# Altium footprint library Modules.PcbLib: 1 footprints
Each footprint in its own frame and in the unit in brackets; x right, y up, seen from the top. Pads: shape width x height; smd on the part's side, far side on the other; paste and mask are expansions set on the pad; w line width, h text height; cw(c..) or ccw(c..) is an arc to the next point about the centre after c.
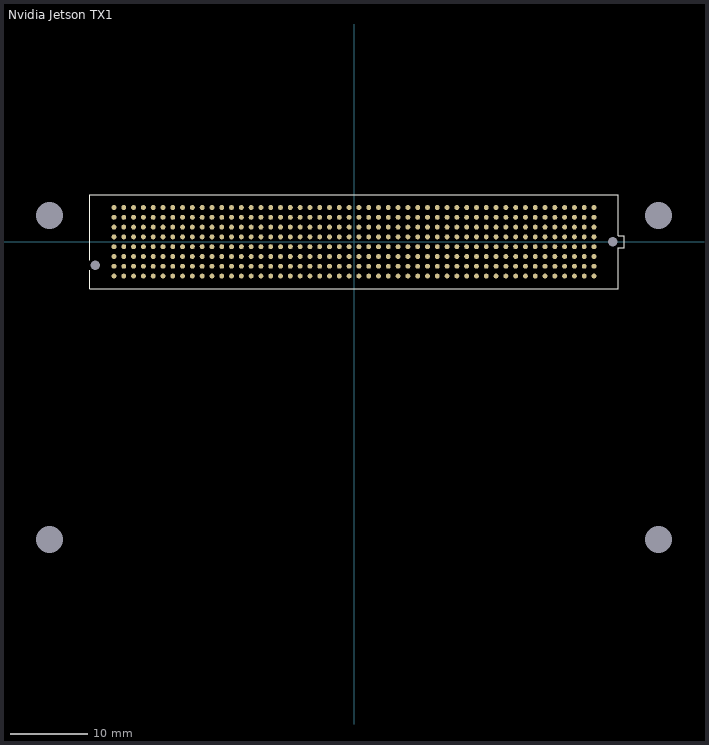
[diagram p0: the footprint, top view; thin cyan lines are the x and y axes]

## Nvidia Jetson TX1 [mm]
pads (406):
  round 0 hole 3.5 unplated: 0(-39.501,-38.6) 0(-39.501,3.4) 0(39.499,-38.6) 0(39.499,3.4)
  round 0 hole 1.27 unplated: 0(-33.541,-3.048) 0(33.541,0)
  round 0.635 smd paste+0.254 mask+0.05: A1(31.115,4.445) A2(29.845,4.445) A3(28.575,4.445) A4(27.305,4.445) A5(26.035,4.445) A6(24.765,4.445) A7(23.495,4.445) A8(22.225,4.445) A9(20.955,4.445) A10(19.685,4.445) A11(18.415,4.445) A12(17.145,4.445) A13(15.875,4.445) A14(14.605,4.445) A15(13.335,4.445) A16(12.065,4.445) A17(10.795,4.445) A18(9.525,4.445) A19(8.255,4.445) A20(6.985,4.445) A21(5.715,4.445) A22(4.445,4.445) A23(3.175,4.445) A24(1.905,4.445) A25(0.635,4.445) A26(-0.635,4.445) A27(-1.905,4.445) A28(-3.175,4.445) A29(-4.445,4.445) A30(-5.715,4.445) A31(-6.985,4.445) A32(-8.255,4.445) A33(-9.525,4.445) A34(-10.795,4.445) A35(-12.065,4.445) A36(-13.335,4.445) A37(-14.605,4.445) A38(-15.875,4.445) A39(-17.145,4.445) A40(-18.415,4.445) A41(-19.685,4.445) A42(-20.955,4.445) A43(-22.225,4.445) A44(-23.495,4.445) A45(-24.765,4.445) A46(-26.035,4.445) A47(-27.305,4.445) A48(-28.575,4.445) A49(-29.845,4.445) A50(-31.115,4.445) B1(31.115,3.175) B2(29.845,3.175) B3(28.575,3.175) B4(27.305,3.175) B5(26.035,3.175) B6(24.765,3.175) B7(23.495,3.175) B8(22.225,3.175) B9(20.955,3.175) B10(19.685,3.175) B11(18.415,3.175) B12(17.145,3.175) B13(15.875,3.175) B14(14.605,3.175) B15(13.335,3.175) B16(12.065,3.175) B17(10.795,3.175) B18(9.525,3.175) B19(8.255,3.175) B20(6.985,3.175) B21(5.715,3.175) B22(4.445,3.175) B23(3.175,3.175) B24(1.905,3.175) B25(0.635,3.175) B26(-0.635,3.175) B27(-1.905,3.175) B28(-3.175,3.175) B29(-4.445,3.175) B30(-5.715,3.175) B31(-6.985,3.175) B32(-8.255,3.175) B33(-9.525,3.175) B34(-10.795,3.175) B35(-12.065,3.175) B36(-13.335,3.175) B37(-14.605,3.175) B38(-15.875,3.175) B39(-17.145,3.175) B40(-18.415,3.175) B41(-19.685,3.175) B42(-20.955,3.175) B43(-22.225,3.175) B44(-23.495,3.175) B45(-24.765,3.175) B46(-26.035,3.175) B47(-27.305,3.175) B48(-28.575,3.175) B49(-29.845,3.175) B50(-31.115,3.175) C1(31.115,1.905) C2(29.845,1.905) C3(28.575,1.905) C4(27.305,1.905) C5(26.035,1.905) C6(24.765,1.905) C7(23.495,1.905) C8(22.225,1.905) C9(20.955,1.905) C10(19.685,1.905) C11(18.415,1.905) C12(17.145,1.905) C13(15.875,1.905) C14(14.605,1.905) C15(13.335,1.905) C16(12.065,1.905) C17(10.795,1.905) C18(9.525,1.905) C19(8.255,1.905) C20(6.985,1.905) C21(5.715,1.905) C22(4.445,1.905) C23(3.175,1.905) C24(1.905,1.905) C25(0.635,1.905) C26(-0.635,1.905) C27(-1.905,1.905) C28(-3.175,1.905) C29(-4.445,1.905) C30(-5.715,1.905) C31(-6.985,1.905) C32(-8.255,1.905) C33(-9.525,1.905) C34(-10.795,1.905) C35(-12.065,1.905) C36(-13.335,1.905) C37(-14.605,1.905) C38(-15.875,1.905) C39(-17.145,1.905) C40(-18.415,1.905) C41(-19.685,1.905) C42(-20.955,1.905) C43(-22.225,1.905) C44(-23.495,1.905) C45(-24.765,1.905) C46(-26.035,1.905) C47(-27.305,1.905) C48(-28.575,1.905) C49(-29.845,1.905) C50(-31.115,1.905) D1(31.115,0.635) D2(29.845,0.635) D3(28.575,0.635) D4(27.305,0.635) D5(26.035,0.635) D6(24.765,0.635) D7(23.495,0.635) D8(22.225,0.635) D9(20.955,0.635) D10(19.685,0.635) D11(18.415,0.635) D12(17.145,0.635) D13(15.875,0.635) D14(14.605,0.635) D15(13.335,0.635) D16(12.065,0.635) D17(10.795,0.635) D18(9.525,0.635) D19(8.255,0.635) D20(6.985,0.635) D21(5.715,0.635) D22(4.445,0.635) D23(3.175,0.635) D24(1.905,0.635) D25(0.635,0.635) D26(-0.635,0.635) D27(-1.905,0.635) D28(-3.175,0.635) D29(-4.445,0.635) D30(-5.715,0.635) D31(-6.985,0.635) D32(-8.255,0.635) D33(-9.525,0.635) D34(-10.795,0.635) D35(-12.065,0.635) D36(-13.335,0.635) D37(-14.605,0.635) D38(-15.875,0.635) D39(-17.145,0.635) D40(-18.415,0.635) D41(-19.685,0.635) D42(-20.955,0.635) D43(-22.225,0.635) D44(-23.495,0.635) D45(-24.765,0.635) D46(-26.035,0.635) D47(-27.305,0.635) D48(-28.575,0.635) D49(-29.845,0.635) D50(-31.115,0.635) E1(31.115,-0.635) E2(29.845,-0.635) E3(28.575,-0.635) E4(27.305,-0.635) E5(26.035,-0.635) E6(24.765,-0.635) E7(23.495,-0.635) E8(22.225,-0.635) E9(20.955,-0.635) E10(19.685,-0.635) E11(18.415,-0.635) E12(17.145,-0.635) E13(15.875,-0.635) E14(14.605,-0.635) E15(13.335,-0.635) E16(12.065,-0.635) E17(10.795,-0.635) E18(9.525,-0.635) E19(8.255,-0.635) E20(6.985,-0.635) E21(5.715,-0.635) E22(4.445,-0.635) E23(3.175,-0.635) E24(1.905,-0.635) E25(0.635,-0.635) E26(-0.635,-0.635) E27(-1.905,-0.635) E28(-3.175,-0.635) E29(-4.445,-0.635) E30(-5.715,-0.635) E31(-6.985,-0.635) E32(-8.255,-0.635) E33(-9.525,-0.635) E34(-10.795,-0.635) E35(-12.065,-0.635) E36(-13.335,-0.635) E37(-14.605,-0.635) E38(-15.875,-0.635) E39(-17.145,-0.635) E40(-18.415,-0.635) E41(-19.685,-0.635) E42(-20.955,-0.635) E43(-22.225,-0.635) E44(-23.495,-0.635) E45(-24.765,-0.635) E46(-26.035,-0.635) E47(-27.305,-0.635) E48(-28.575,-0.635) E49(-29.845,-0.635) E50(-31.115,-0.635) F1(31.115,-1.905) F2(29.845,-1.905) F3(28.575,-1.905) F4(27.305,-1.905) F5(26.035,-1.905) F6(24.765,-1.905) F7(23.495,-1.905) F8(22.225,-1.905) F9(20.955,-1.905) F10(19.685,-1.905) F11(18.415,-1.905) F12(17.145,-1.905) F13(15.875,-1.905) F14(14.605,-1.905) F15(13.335,-1.905) F16(12.065,-1.905) F17(10.795,-1.905) F18(9.525,-1.905) F19(8.255,-1.905) F20(6.985,-1.905) F21(5.715,-1.905) F22(4.445,-1.905) F23(3.175,-1.905) F24(1.905,-1.905) F25(0.635,-1.905) F26(-0.635,-1.905) F27(-1.905,-1.905) F28(-3.175,-1.905) F29(-4.445,-1.905) F30(-5.715,-1.905) F31(-6.985,-1.905) F32(-8.255,-1.905) F33(-9.525,-1.905) F34(-10.795,-1.905) F35(-12.065,-1.905) F36(-13.335,-1.905) F37(-14.605,-1.905) F38(-15.875,-1.905) F39(-17.145,-1.905) F40(-18.415,-1.905) F41(-19.685,-1.905) F42(-20.955,-1.905) F43(-22.225,-1.905) F44(-23.495,-1.905) F45(-24.765,-1.905) F46(-26.035,-1.905) F47(-27.305,-1.905) F48(-28.575,-1.905) F49(-29.845,-1.905) F50(-31.115,-1.905) G1(31.115,-3.175) G2(29.845,-3.175) G3(28.575,-3.175) G4(27.305,-3.175) G5(26.035,-3.175) G6(24.765,-3.175) G7(23.495,-3.175) G8(22.225,-3.175) G9(20.955,-3.175) G10(19.685,-3.175) G11(18.415,-3.175) G12(17.145,-3.175) G13(15.875,-3.175) G14(14.605,-3.175) G15(13.335,-3.175) G16(12.065,-3.175) G17(10.795,-3.175) G18(9.525,-3.175) G19(8.255,-3.175) G20(6.985,-3.175) G21(5.715,-3.175) G22(4.445,-3.175) G23(3.175,-3.175) G24(1.905,-3.175) G25(0.635,-3.175) G26(-0.635,-3.175) G27(-1.905,-3.175) G28(-3.175,-3.175) G29(-4.445,-3.175) G30(-5.715,-3.175) G31(-6.985,-3.175) G32(-8.255,-3.175) G33(-9.525,-3.175) G34(-10.795,-3.175) G35(-12.065,-3.175) G36(-13.335,-3.175) G37(-14.605,-3.175) G38(-15.875,-3.175) G39(-17.145,-3.175) G40(-18.415,-3.175) G41(-19.685,-3.175) G42(-20.955,-3.175) G43(-22.225,-3.175) G44(-23.495,-3.175) G45(-24.765,-3.175) G46(-26.035,-3.175) G47(-27.305,-3.175) G48(-28.575,-3.175) G49(-29.845,-3.175) G50(-31.115,-3.175) H1(31.115,-4.445) H2(29.845,-4.445) H3(28.575,-4.445) H4(27.305,-4.445) H5(26.035,-4.445) H6(24.765,-4.445) H7(23.495,-4.445) H8(22.225,-4.445) H9(20.955,-4.445) H10(19.685,-4.445) H11(18.415,-4.445) H12(17.145,-4.445) H13(15.875,-4.445) H14(14.605,-4.445) H15(13.335,-4.445) H16(12.065,-4.445) H17(10.795,-4.445) H18(9.525,-4.445) H19(8.255,-4.445) H20(6.985,-4.445) H21(5.715,-4.445) H22(4.445,-4.445) H23(3.175,-4.445) H24(1.905,-4.445) H25(0.635,-4.445) H26(-0.635,-4.445) H27(-1.905,-4.445) H28(-3.175,-4.445) H29(-4.445,-4.445) H30(-5.715,-4.445) H31(-6.985,-4.445) H32(-8.255,-4.445) H33(-9.525,-4.445) H34(-10.795,-4.445) H35(-12.065,-4.445) H36(-13.335,-4.445) H37(-14.605,-4.445) H38(-15.875,-4.445) H39(-17.145,-4.445) H40(-18.415,-4.445) H41(-19.685,-4.445) H42(-20.955,-4.445) H43(-22.225,-4.445) H44(-23.495,-4.445) H45(-24.765,-4.445) H46(-26.035,-4.445) H47(-27.305,-4.445) H48(-28.575,-4.445) H49(-29.845,-4.445) H50(-31.115,-4.445)
Top Overlay:
  lines w0.15: -34.239,-3.683 -34.239,-6.071 34.239,-6.071 34.239,-3.035 34.239,-0.762 35.052,-0.762 35.052,0.762 34.239,0.762 34.239,3.035 34.239,6.071 -34.239,6.071 -34.239,-2.413
3D body "JetPack_TX1.stp": height 14.16, standoff 0, extent -43.523,-42.612 43.477,7.388
3D body "SEAM-50-02.0-L-08-2-A-K-TR.stp": height 5.66, standoff -1.22, extent -34.239,-6.07 35.128,6.071